# Altium footprint library QFN.PcbLib: 54 footprints (part 4 of 4)
Each footprint in its own frame and in the unit in brackets; x right, y up, seen from the top. Pads: shape width x height; smd on the part's side, far side on the other; paste and mask are expansions set on the pad; w line width, h text height; cw(c..) or ccw(c..) is an arc to the next point about the centre after c.
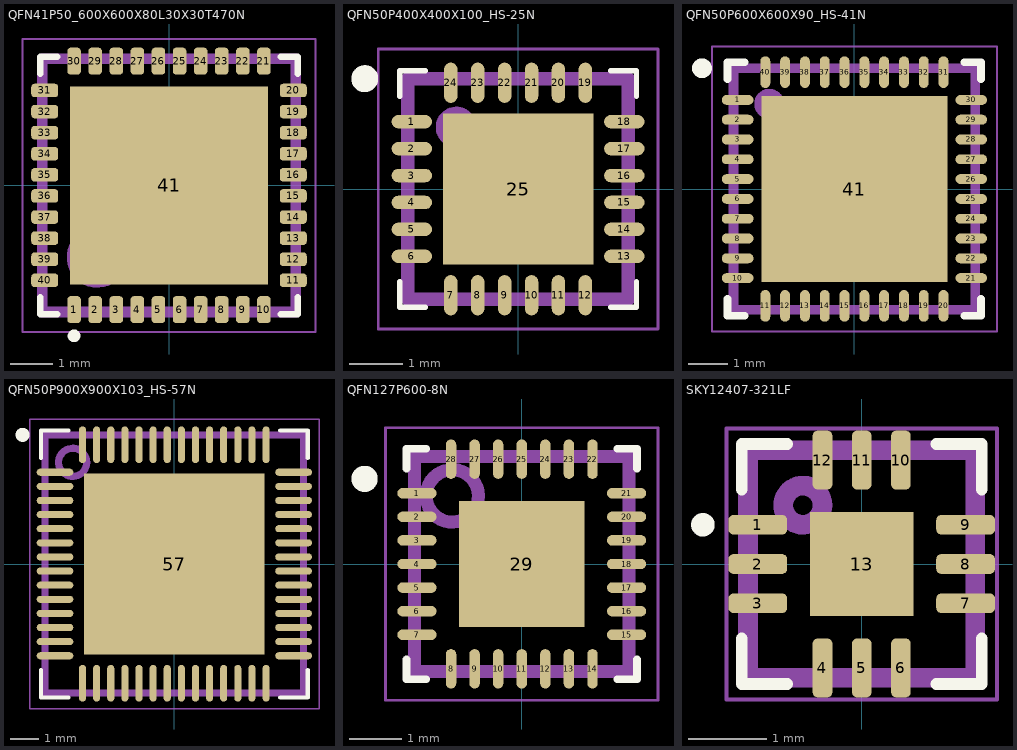
[diagram p3: the footprints below, top view; thin cyan lines are the x and y axes]

## QFN41P50_600X600X80L30X30T470N [mm] "Quad Flat No-Lead (QFN with Tab), 0.50 mm pitch; square, 10 pin X 10 pin, 6.00 mm L X 6.00 mm W X 0.80 mm H body"
height 0.8
pads (41):
  rrect50% 0.32x0.64 smd: 1(-2.25,-2.945) 2(-1.75,-2.945) 3(-1.25,-2.945) 4(-0.75,-2.945) 5(-0.25,-2.945) 6(0.25,-2.945) 7(0.75,-2.945) 8(1.25,-2.945) 9(1.75,-2.945) 10(2.25,-2.945) 21(2.25,2.945) 22(1.75,2.945) 23(1.25,2.945) 24(0.75,2.945) 25(0.25,2.945) 26(-0.25,2.945) 27(-0.75,2.945) 28(-1.25,2.945) 29(-1.75,2.945) 30(-2.25,2.945)
  rrect50% 0.64x0.32 smd: 11(2.945,-2.25) 12(2.945,-1.75) 13(2.945,-1.25) 14(2.945,-0.75) 15(2.945,-0.25) 16(2.945,0.25) 17(2.945,0.75) 18(2.945,1.25) 19(2.945,1.75) 20(2.945,2.25) 31(-2.945,2.25) 32(-2.945,1.75) 33(-2.945,1.25) 34(-2.945,0.75) 35(-2.945,0.25) 36(-2.945,-0.25) 37(-2.945,-0.75) 38(-2.945,-1.25) 39(-2.945,-1.75) 40(-2.945,-2.25)
  rect 4.7x4.7 smd paste-4.7: 41(0,0)
Top Overlay:
  circle w0.15: c-2.25,-3.565 r0.075
  lines w0.15: -3.05,-2.65 -3.05,-3.05 -2.65,-3.05 ; -3.05,2.65 -3.05,3.05 -2.65,3.05 ; 2.65,-3.05 3.05,-3.05 3.05,-2.65 ; 2.65,3.05 3.05,3.05 3.05,2.65
Top Paste:
  region: -0.345,0.345 -2.005,0.345 -2.005,2.005 -0.345,2.005
  region: -0.345,-2.005 -2.005,-2.005 -2.005,-0.345 -0.345,-0.345
  region: 2.005,0.345 0.345,0.345 0.345,2.005 2.005,2.005
  region: 2.005,-2.005 0.345,-2.005 0.345,-0.345 2.005,-0.345
Top Assembly:
  circle w0.25: c-1.7,-1.7 r0.6
  lines w0.25: -3,-3 3,-3 3,3 -3,3 -3,-3
  text ".Designator" at -2.3,-0.4 h1.5
Top Courtyard:
  circle w0.05: c0,0 r0.25
  lines w0.05: -0.35,0 0.35,0 ; 0,-0.35 0,0.35 ; -3.47,-3.47 3.47,-3.47 3.47,3.47 -3.47,3.47 -3.47,-3.47
3D body "QFN41P50_600X600X80L30X30T470.STEP": height 0.8, standoff 0, extent -3.05,-3.05 3.05,3.05

## QFN50P400X400X100_HS-25N [mm] "QFN, 24-Leads, Body 4.00x4.00mm, Pitch 0.50mm, Thermal Pad 2.80x2.80mm, IPC Medium Density"
height 1
pads (25):
  oval 0.75x0.25 smd: 1(-1.975,1.25) 2(-1.975,0.75) 3(-1.975,0.25) 4(-1.975,-0.25) 5(-1.975,-0.75) 6(-1.975,-1.25) 13(1.975,-1.25) 14(1.975,-0.75) 15(1.975,-0.25) 16(1.975,0.25) 17(1.975,0.75) 18(1.975,1.25)
  oval 0.25x0.75 smd: 7(-1.25,-1.975) 8(-0.75,-1.975) 9(-0.25,-1.975) 10(0.25,-1.975) 11(0.75,-1.975) 12(1.25,-1.975) 19(1.25,1.975) 20(0.75,1.975) 21(0.25,1.975) 22(-0.25,1.975) 23(-0.75,1.975) 24(-1.25,1.975)
  rect 2.8x2.8 smd: 25(0,0)
Top Overlay:
  circle w0.25: c-2.85,2.05 r0.125
  lines w0.1: -2.2,-1.725 -2.2,-2.2 -1.725,-2.2 ; -2.2,1.725 -2.2,2.2 -1.725,2.2 ; 1.725,-2.2 2.2,-2.2 2.2,-1.725 ; 1.725,2.2 2.2,2.2 2.2,1.725
Top Assembly:
  circle w0.25: c-1.15,1.15 r0.255
  lines w0.25: -2.05,-2.05 -2.05,2.05 2.05,2.05 2.05,-2.05 -2.05,-2.05
  text ".Designator" at -1.8,-0.4 h1.5
Top Courtyard:
  lines w0.05: -2.6,-2.6 -2.6,2.6 2.6,2.6 2.6,-2.6 -2.6,-2.6
  lines w0.1: -0.5,0 0.5,0 ; 0,-0.5 0,0.5
3D body "QFN50P400X400X100_HS-25N.step": height 1, standoff 0, extent -2.051,-2.051 2.051,2.051

## QFN50P600X600X90_HS-41N [mm] "QFN, 40-Leads, Body 6.00x6.00mm, Pitch 0.50mm, Thermal Pad 4.70x4.70mm, IPC Medium Density"
height 0.9
pads (41):
  oval 0.8x0.25 smd: 1(-2.95,2.25) 2(-2.95,1.75) 3(-2.95,1.25) 4(-2.95,0.75) 5(-2.95,0.25) 6(-2.95,-0.25) 7(-2.95,-0.75) 8(-2.95,-1.25) 9(-2.95,-1.75) 10(-2.95,-2.25) 21(2.95,-2.25) 22(2.95,-1.75) 23(2.95,-1.25) 24(2.95,-0.75) 25(2.95,-0.25) 26(2.95,0.25) 27(2.95,0.75) 28(2.95,1.25) 29(2.95,1.75) 30(2.95,2.25)
  oval 0.25x0.8 smd: 11(-2.25,-2.95) 12(-1.75,-2.95) 13(-1.25,-2.95) 14(-0.75,-2.95) 15(-0.25,-2.95) 16(0.25,-2.95) 17(0.75,-2.95) 18(1.25,-2.95) 19(1.75,-2.95) 20(2.25,-2.95) 31(2.25,2.95) 32(1.75,2.95) 33(1.25,2.95) 34(0.75,2.95) 35(0.25,2.95) 36(-0.25,2.95) 37(-0.75,2.95) 38(-1.25,2.95) 39(-1.75,2.95) 40(-2.25,2.95)
  rect 4.7x4.7 smd: 41(0,0)
Top Overlay:
  circle w0.25: c-3.85,3.05 r0.125
  lines w0.2: -3.2,-2.775 -3.2,-3.2 -2.775,-3.2 ; -3.2,2.775 -3.2,3.2 -2.775,3.2 ; 2.775,-3.2 3.2,-3.2 3.2,-2.775 ; 2.775,3.2 3.2,3.2 3.2,2.775
Top Assembly:
  circle w0.25: c-2.15,2.15 r0.255
  lines w0.25: -3.05,-3.05 3.05,-3.05 3.05,3.05 -3.05,3.05 -3.05,-3.05
  text ".Designator" at -2.5,-0.3 h1.5
Top Courtyard:
  lines w0.05: -3.6,-3.6 3.6,-3.6 3.6,3.6 -3.6,3.6 -3.6,-3.6
  lines w0.1: -0.5,0 0.5,0 ; 0,-0.5 0,0.5
3D body "QFN50P600X600X90_HS-41N.step": height 0.9, standoff 0, extent -3.051,-3.051 3.051,3.051

## QFN50P900X900X103_HS-57N [mm] "QFN, 56-Leads, Body 9.00x9.00mm, Pitch 0.50mm, Thermal Pad 6.40x6.40mm, IPC Medium Density"
height 1.03
pads (57):
  oval 1.3x0.25 smd: 1(-4.225,3.25) 2(-4.225,2.75) 3(-4.225,2.25) 4(-4.225,1.75) 5(-4.225,1.25) 6(-4.225,0.75) 7(-4.225,0.25) 8(-4.225,-0.25) 9(-4.225,-0.75) 10(-4.225,-1.25) 11(-4.225,-1.75) 12(-4.225,-2.25) 13(-4.225,-2.75) 14(-4.225,-3.25) 29(4.225,-3.25) 30(4.225,-2.75) 31(4.225,-2.25) 32(4.225,-1.75) 33(4.225,-1.25) 34(4.225,-0.75) 35(4.225,-0.25) 36(4.225,0.25) 37(4.225,0.75) 38(4.225,1.25) 39(4.225,1.75) 40(4.225,2.25) 41(4.225,2.75) 42(4.225,3.25)
  oval 0.25x1.3 smd: 15(-3.25,-4.225) 16(-2.75,-4.225) 17(-2.25,-4.225) 18(-1.75,-4.225) 19(-1.25,-4.225) 20(-0.75,-4.225) 21(-0.25,-4.225) 22(0.25,-4.225) 23(0.75,-4.225) 24(1.25,-4.225) 25(1.75,-4.225) 26(2.25,-4.225) 27(2.75,-4.225) 28(3.25,-4.225) 43(3.25,4.225) 44(2.75,4.225) 45(2.25,4.225) 46(1.75,4.225) 47(1.25,4.225) 48(0.75,4.225) 49(0.25,4.225) 50(-0.25,4.225) 51(-0.75,4.225) 52(-1.25,4.225) 53(-1.75,4.225) 54(-2.25,4.225) 55(-2.75,4.225) 56(-3.25,4.225)
  rect 6.4x6.4 smd: 57(0,0)
Top Overlay:
  circle w0.25: c-5.375,4.575 r0.125
  lines w0.15: -4.725,-3.75 -4.725,-4.725 -3.75,-4.725 ; -4.725,3.75 -4.725,4.725 -3.75,4.725 ; 3.75,-4.725 4.725,-4.725 4.725,-3.75 ; 3.75,4.725 4.725,4.725 4.725,3.75
Top Assembly:
  circle w0.25: c-3.6,3.6 r0.5
  lines w0.25: -4.575,-4.575 4.575,-4.575 4.575,4.575 -4.575,4.575 -4.575,-4.575
  text ".Designator" at -3.4,-0.618 h1.5
Top Courtyard:
  lines w0.05: -5.125,-5.125 5.125,-5.125 5.125,5.125 -5.125,5.125 -5.125,-5.125
  lines w0.1: -0.5,0 0.5,0 ; 0,-0.5 0,0.5
3D body "QFN50P900X900X103_HS-57N.step": height 1.03, standoff 0, extent -4.576,-4.576 4.576,4.576

## QFN127P600-8N [mm] "28-Lead Very Thin Plastic Quad Flat, No Lead Package (RNB) - 4x4x1 mm Body [VQFN] With 2.40mm Exposed Pad; Atmel Legacy GPC ZBV"
height 1
pads (29):
  oval 0.75x0.2 smd: 1(-2,1.35) 2(-2,0.9) 3(-2,0.45) 4(-2,0) 5(-2,-0.45) 6(-2,-0.9) 7(-2,-1.35) 15(2,-1.35) 16(2,-0.9) 17(2,-0.45) 18(2,0) 19(2,0.45) 20(2,0.9) 21(2,1.35)
  oval 0.2x0.75 smd: 8(-1.35,-2) 9(-0.9,-2) 10(-0.45,-2) 11(0,-2) 12(0.45,-2) 13(0.9,-2) 14(1.35,-2) 22(1.35,2) 23(0.9,2) 24(0.45,2) 25(0,2) 26(-0.45,2) 27(-0.9,2) 28(-1.35,2)
  rect 2.4x2.4 smd: 29(0,0)
Top Overlay:
  circle w0.25: c-3,1.625 r0.125
  lines w0.15: -2.2,-1.825 -2.2,-2.2 -1.825,-2.2 ; -2.2,1.825 -2.2,2.2 -1.825,2.2 ; 1.825,-2.2 2.2,-2.2 2.2,-1.825 ; 1.825,2.2 2.2,2.2 2.2,1.825
Top Assembly:
  circle w0.25: c-1.325,1.3 r0.5
  lines w0.25: -2.05,-2.05 2.05,-2.05 2.05,2.05 -2.05,2.05 -2.05,-2.05
  text ".Designator" at -3.1,2.9 h1.52
Top Courtyard:
  lines w0.05: -2.6,-2.6 2.6,-2.6 2.6,2.6 -2.6,2.6 -2.6,-2.6
  lines w0.1: -0.5,0 0.5,0 ; 0,-0.5 0,0.5
3D body "QFN127P600-8N.step": height 1, standoff 0, extent -2.051,-2.051 2.051,2.051

## SKY12407-321LF [mm]
height 0.8
pads (13):
  rrect51% 0.75x0.25 smd: 1(-1.325,0.5) 2(-1.325,0) 3(-1.325,-0.5) 7(1.325,-0.5) 8(1.325,0) 9(1.325,0.5)
  rrect51% 0.25x0.75 smd: 4(-0.5,-1.325) 5(0,-1.325) 6(0.5,-1.325) 10(0.5,1.325) 11(0,1.325) 12(-0.5,1.325)
  rect 1.32x1.32 smd paste-1.5: 13(0,0)
Top Overlay:
  circle w0.15: c-2.025,0.5 r0.075
  lines w0.15: -1.53,-0.95 -1.53,-1.53 -0.95,-1.53 ; -1.53,0.95 -1.53,1.53 -0.95,1.53 ; 0.95,-1.53 1.53,-1.53 1.53,-0.95 ; 0.95,1.53 1.53,1.53 1.53,0.95
Top Paste:
  region: 0.11,0.11 0.11,0.64 0.64,0.64 0.64,0.11
  region: -0.64,0.11 -0.64,0.64 -0.11,0.64 -0.11,0.11
  region: 0.11,-0.64 0.11,-0.11 0.64,-0.11 0.64,-0.64
  region: -0.64,-0.64 -0.64,-0.11 -0.11,-0.11 -0.11,-0.64
Top Assembly:
  circle w0.25: c-0.75,0.75 r0.25
  lines w0.25: -1.45,-1.45 1.45,-1.45 1.45,1.45 -1.45,1.45 -1.45,-1.45
  text ".Designator" at -1,-1 h1.5
Top Courtyard:
  circle w0.05: c0,0 r0.25
  lines w0.05: -0.35,0 0.35,0 ; 0,-0.35 0,0.35 ; -1.725,-1.725 -1.725,1.725 1.725,1.725 1.725,-1.725 -1.725,-1.725
3D body "PQFN13P50_290X290X90L32X30T150.STEP": height 0.9, standoff 0, extent -1.45,-1.45 1.45,1.45